# Altium footprint library Standard2.PcbLib: 423 footprints (part 10 of 27)
Each footprint in its own frame and in the unit in brackets; x right, y up, seen from the top. Pads: shape width x height; smd on the part's side, far side on the other; paste and mask are expansions set on the pad; w line width, h text height; cw(c..) or ccw(c..) is an arc to the next point about the centre after c.
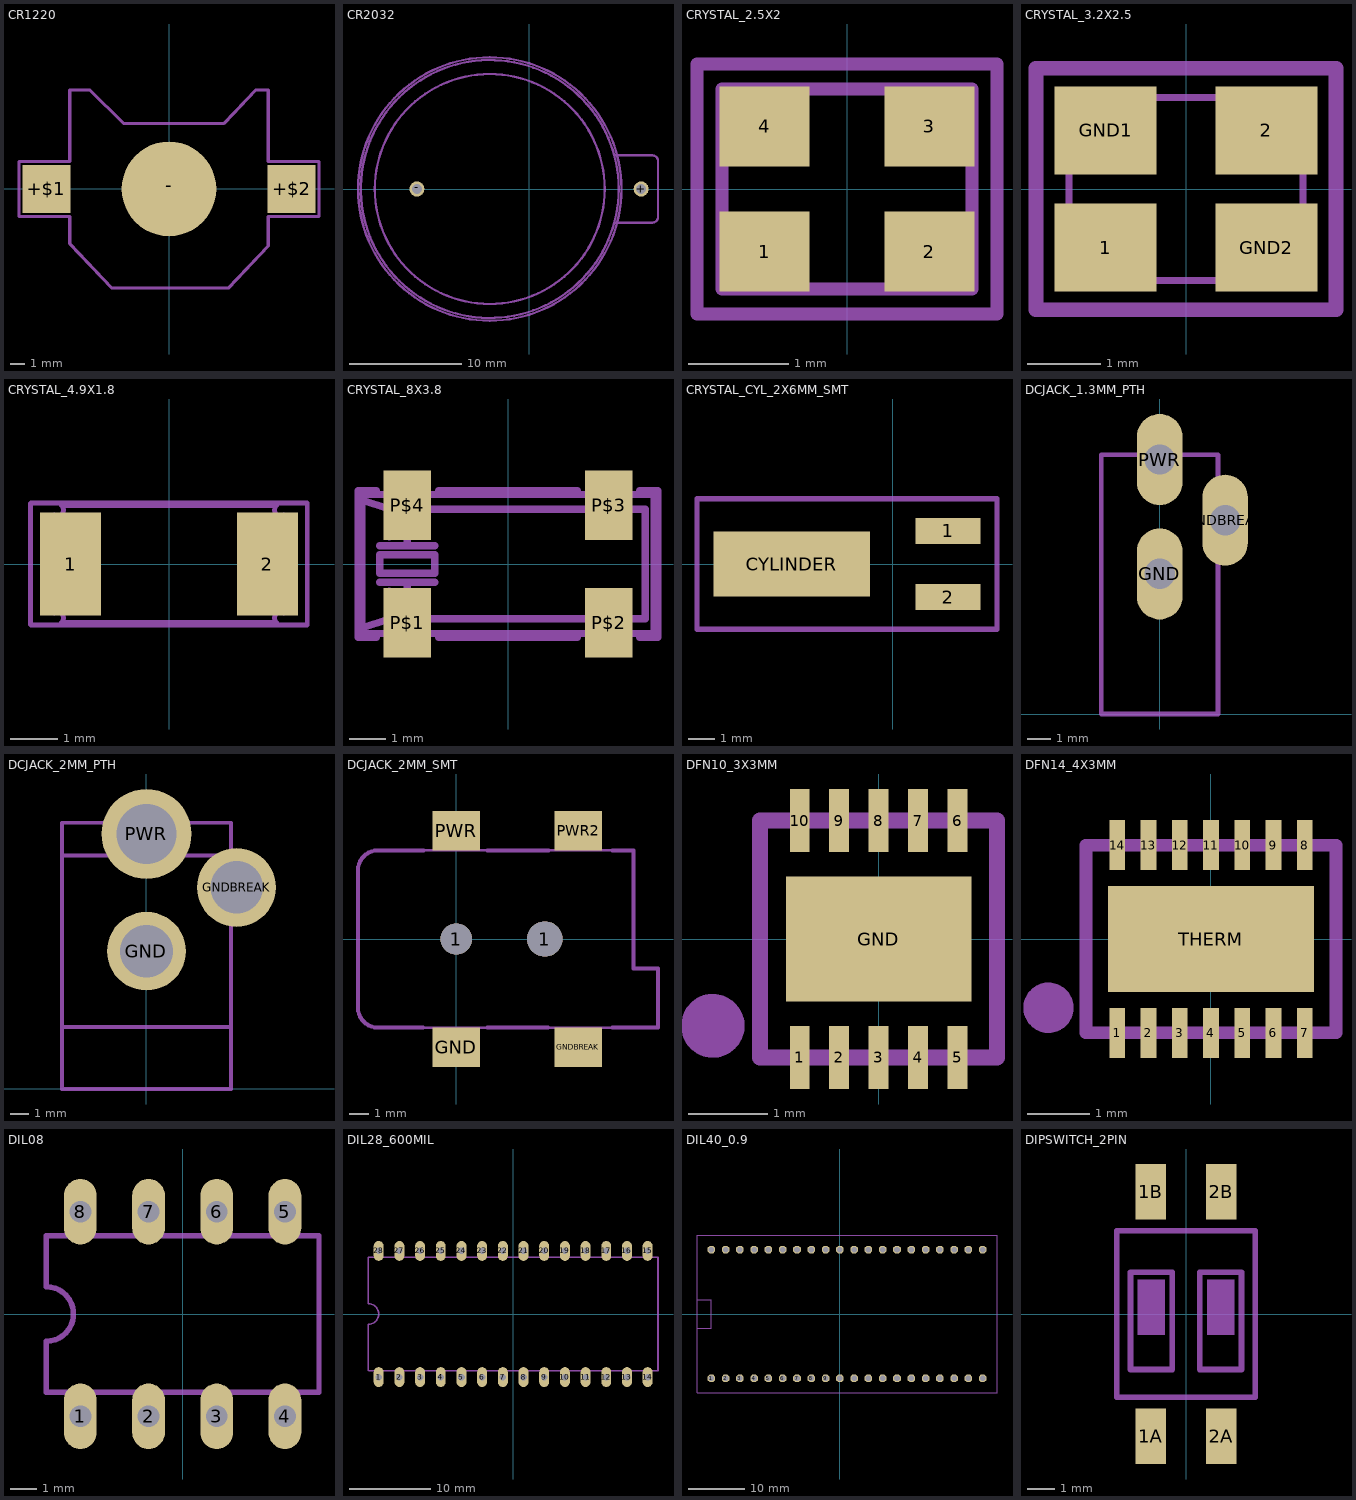
[diagram p9: the footprints below, top view; thin cyan lines are the x and y axes]

## CR1220 [mm]
pads (3):
  rect 3.2x3.2 smd: +$1(-8.225,0) +$2(8.225,0)
  rrect100% 6.35x6.35 smd mask-3.175: -(0,0)
Top Solder:
  circle w0: c0,0 r6.282
Mechanical 2:
  lines w0.203: -6.66,6.652 -6.66,1.84 -10.066,1.84 -10.066,-1.84 -6.66,-1.84 -6.66,-3.672 -3.826,-6.66 3.98,-6.66 6.66,-3.826 6.66,-1.84 10.066,-1.84 10.066,1.84 6.66,1.84 6.66,6.652
Mechanical 18:
  circle w0.203: c-8.279,0 r0.916
  circle w0.203: c8.425,0.154 r0.916
  lines w0.203: -6.66,6.652 -5.334,6.652 -3.048,4.404 3.702,4.404 5.842,6.652 6.66,6.652

## CR2032 [mm]
pads (2):
  round 1.35 hole 0.9: +(10,0) -(-10,0)
Mechanical 2:
  circle w0.203: c-3.5,0 r11.75
Mechanical 18:
  circle w0.203: c-3.5,0 r11.5
  circle w0.203: c-3.5,0 r10.25
  lines w0.203: 7.6,-3 11,-3 ccw(c11,-2.5) 11.5,-2.5 11.5,2.5 ccw(c11,2.5) 11,3 7.6,3

## CRYSTAL_2.5X2 [mm]
pads (4):
  rect 0.9x0.8 smd: 1(-0.825,-0.625) 2(0.825,-0.625) 3(0.825,0.625) 4(-0.825,0.625)
Mechanical 2:
  lines w0.127: -1.5,-1.25 -1.5,1.25 1.5,1.25 1.5,-1.25 -1.5,-1.25
Mechanical 18:
  lines w0.127: -1.25,-1 -1.25,1 1.25,1 1.25,-1 -1.25,-1

## CRYSTAL_3.2X2.5 [mil]
pads (4):
  rect 55.12x47.24 smd: 1(-43.31,-31.5) 2(43.31,31.5) GND1(-43.31,31.5) GND2(43.31,-31.5)
Mechanical 2:
  lines w8: -80.71,-64.96 80.71,-64.96 80.71,64.96 -80.71,64.96 -80.71,-64.96
Mechanical 18:
  lines w3.94: -62.99,-41.34 cw(c-59.05,-45.27) -55.12,-49.21 55.12,-49.21 cw(c59.05,-45.27) 62.99,-41.34 62.99,41.34 cw(c59.05,45.27) 55.12,49.21 -55.12,49.21 cw(c-59.05,45.27) -62.99,41.34 -62.99,-41.34

## CRYSTAL_4.9X1.8 [mm]
pads (2):
  rect 1.3x2.2 smd: 1(-2.1,0) 2(2.1,0)
Mechanical 2:
  lines w0.1: -2.955,-1.294 -2.955,1.294 ; -2.945,-1.3 2.945,-1.3 ; -2.945,1.3 2.945,1.3 ; 2.951,-1.294 2.951,1.294
Mechanical 18:
  lines w0.1: -2.45,-1.05 cw(c-2.375,-1.15) -2.3,-1.25 2.3,-1.25 cw(c2.375,-1.15) 2.45,-1.05 2.45,1.05 cw(c2.375,1.15) 2.3,1.25 -2.3,1.25 cw(c-2.375,1.15) -2.45,1.05 -2.45,-1.05

## CRYSTAL_8X3.8 [mm]
pads (4):
  rect 1.3x1.9 smd: P$1(-2.75,-1.6) P$2(2.75,-1.6) P$3(2.75,1.6) P$4(-2.75,1.6)
Mechanical 2:
  lines w0.203: -3.6,-2 -4.1,-2 -4.1,2 -3.6,2 ; -1.9,-2 1.9,-2 ; -1.9,2 1.9,2 ; 3.6,-2 4.1,-2 4.1,2 3.6,2
Mechanical 18:
  circle w0.203: c-2.75,1.25 r0.25
  circle w0.203: c-2.75,-1.25 r0.25
  lines w0.203: -3.5,-0.5 -2.75,-0.5 ; -3.5,0.5 -2.75,0.5 ; -3.25,-0.75 -3.25,-1.5 ; -3.25,0.75 -3.25,1.5 ; -2.75,-1.25 -2.75,-0.5 ; -2.75,1.25 -2.75,0.5 ; -2,-0.5 -2.75,-0.5 ; -2,0.5 -2.75,0.5 ; -4,-1.75 -4,-1.9 4,-1.9 4,1.9 -4,1.9 -4,1.75 ; -4,-1.75 -4,1.75 ; -4,-1.75 -3.25,-1.5 ; -4,1.75 -3.25,1.5 ; -3.25,-1.5 3.75,-1.5 3.75,1.5 -3.25,1.5 ; -3.5,-0.25 -2,-0.25 -2,0.25 -3.5,0.25 -3.5,-0.25

## CRYSTAL_CYL_2X6MM_SMT [mm]
pads (3):
  rect 2.5x1 smd: 1(2.125,1.27) 2(2.125,-1.27)
  rect 6x2.5 smd: CYLINDER(-3.875,0)
Mechanical 2:
  lines w0.203: -7.5,-2.5 -7.5,2.5 4,2.5 4,-2.5 -7.5,-2.5

## DCJACK_1.3MM_PTH [mm]
pads (3):
  oval 1.95x3.9 hole 1.3: GND(0,6) GNDBREAK(2.8,8.3) PWR(0,10.9)
Mechanical 2:
  lines w0.203: -1.5,11.1 -2.5,11.1 -2.5,0 2.5,0 2.5,11.1 1.5,11.1
Mechanical 18:
  lines w0.127: -2.5,11.1 -2.5,0 2.5,0 2.5,11.1
  lines w0.203: -2.5,11.1 2.5,11.1

## DCJACK_2MM_PTH [mm]
pads (3):
  round 4.2 hole 2.8: GND(0,7.35) GNDBREAK(4.8,10.75)
  round 4.8 hole 3.2: PWR(0,13.6)
Mechanical 2:
  lines w0.203: -2.6,14.2 -4.5,14.2 -4.5,3.3 4.5,3.3 4.5,8.4 ; 2.4,14.2 4.5,14.2 4.5,13.1
Mechanical 18:
  lines w0.203: 4.4,12.45 -4.5,12.45 ; -4.5,3.3 -4.5,0 4.5,0 4.5,3.3 ; -4.5,3.3 4.5,3.3 ; -4.5,3.3 -4.5,12.45 ; -4.5,12.45 -4.5,14.2 2.4,14.2 2.65,14.2 4.5,14.2 4.5,8.4 4.5,8.35 4.5,3.3

## DCJACK_2MM_SMT [mm]
pads (6):
  round 1.6 hole 1.6: 1(0,0)
  round 1.8 hole 1.8: 1(4.5,0)
  rect 2.4x2 smd: GND(0,-5.5) GNDBREAK(6.2,-5.5) PWR(0,5.5) PWR2(6.2,5.5)
Mechanical 2:
  lines w0.203: -1.684,-4.5 -4,-4.5 cw(c-4,-3.5) -5,-3.5 -5,3.5 cw(c-4,3.5) -4,4.5 -1.668,4.5 ; 1.588,-4.5 4.666,-4.5 ; 1.588,4.5 4.682,4.5 ; 7.938,-4.5 10.254,-4.5 10.254,-1.492 9,-1.492 9,4.5 7.938,4.5
Mechanical 18:
  lines w0.127: -5,-3.5 -5,3.5 ; -4,-4.5 10.254,-4.5 10.254,-1.492 9,-1.492 9,4.5 -4,4.5
  lines w0.203: -5,-3.5 ccw(c-4,-3.5) -4,-4.5 ; -5,3.5 cw(c-4,3.5) -4,4.5

## DFN10_3X3MM [mil]
pads (11):
  rect 9.84x31.5 smd: 1(-39.37,-59.06) 2(-19.69,-59.06) 3(0,-59.06) 4(19.69,-59.06) 5(39.37,-59.06) 6(39.37,59.06) 7(19.69,59.06) 8(0,59.06) 9(-19.69,59.06) 10(-39.37,59.06)
  rect 92.52x62.2 smd paste-46.26: GND(0,0)
Top Paste:
  rectangle: -39.37,3.94 -19.69,23.62
  rectangle: -39.37,-23.62 -19.69,-3.94
  rectangle: 19.69,3.94 39.37,23.62
  rectangle: 19.69,-23.62 39.37,-3.94
  rectangle: -11.81,-23.62 11.81,23.62
Mechanical 2:
  circle w16: c-82.68,-43.31 r7.87
  lines w8: -59.06,-59.06 -59.06,59.06 ; 59.06,-59.06 59.06,59.06
Mechanical 18:
  lines w5: -59.06,-59.06 -59.06,59.06 ; 59.06,-59.06 59.06,59.06
  lines w8: -59.06,-59.06 59.06,-59.06 ; -59.06,59.06 59.06,59.06

## DFN14_4X3MM [mil]
pads (15):
  rect 9.84x31.5 smd: 1(-59.06,-59.06) 2(-39.37,-59.06) 3(-19.69,-59.06) 4(0,-59.06) 5(19.69,-59.06) 6(39.37,-59.06) 7(59.06,-59.06) 8(59.06,59.06) 9(39.37,59.06) 10(19.69,59.06) 11(0,59.06) 12(-19.69,59.06) 13(-39.37,59.06) 14(-59.06,59.06)
  rect 129.92x66.93 smd paste-64.96: THERM(0,0)
Top Paste:
  rectangle: -31.5,-23.62 -7.87,23.62
  rectangle: 7.87,-23.62 31.5,23.62
  rectangle: -61.02,-23.62 -37.4,23.62
  rectangle: 37.4,-23.62 61.02,23.62
Mechanical 2:
  circle w16: c-102.36,-43.31 r7.87
  lines w8: -78.74,-59.06 -78.74,59.06 ; 78.74,-59.06 78.74,59.06
Mechanical 18:
  lines w5: -78.74,-59.06 -78.74,59.06 ; 78.74,-59.06 78.74,59.06
  lines w8: -78.74,-59.06 78.74,-59.06 ; -78.74,59.06 78.74,59.06

## DIL08 [mil]
pads (8):
  oval 48x96 hole 32: 1(-150,-150) 2(-50,-150) 3(50,-150) 4(150,-150) 5(150,150) 6(50,150) 7(-50,150) 8(-150,150)
Mechanical 2:
  lines w8: -200,-115 -200,-40 ccw(c-200,0) -200,40 -200,115 200,115 200,-115 -200,-115

## DIL28_600MIL [mil]
pads (28):
  oval 48x96 hole 32: 1(-650,-305.12) 2(-550,-305.12) 3(-450,-305.12) 4(-350,-305.12) 5(-250,-305.12) 6(-150,-305.12) 7(-50,-305.12) 8(50,-305.12) 9(150,-305.12) 10(250,-305.12) 11(350,-305.12) 12(450,-305.12) 13(550,-305.12) 14(650,-305.12) 15(650,305.12) 16(550,305.12) 17(450,305.12) 18(350,305.12) 19(250,305.12) 20(150,305.12) 21(50,305.12) 22(-50,305.12) 23(-150,305.12) 24(-250,305.12) 25(-350,305.12) 26(-450,305.12) 27(-550,305.12) 28(-650,305.12)
Mechanical 2:
  lines w8: -700,-273.62 -700,-50 ccw(c-700,0) -700,50 -700,273.62 700,273.62 700,-273.62 -695,-273.62

## DIL40_0.9 [mm]
pads (40):
  oct 1.353x1.353 hole 1: 1(-22.86,-11.43) 2(-20.32,-11.43) 3(-17.78,-11.43) 4(-15.24,-11.43) 5(-12.7,-11.43) 6(-10.16,-11.43) 7(-7.62,-11.43) 8(-5.08,-11.43) 9(-2.54,-11.43) 10(0,-11.43) 11(2.54,-11.43) 12(5.08,-11.43) 13(7.62,-11.43) 14(10.16,-11.43) 15(12.7,-11.43) 16(15.24,-11.43) 17(17.78,-11.43) 18(20.32,-11.43) 19(22.86,-11.43) 20(25.4,-11.43) 21(25.4,11.43) 22(22.86,11.43) 23(20.32,11.43) 24(17.78,11.43) 25(15.24,11.43) 26(12.7,11.43) 27(10.16,11.43) 28(7.62,11.43) 29(5.08,11.43) 30(2.54,11.43) 31(0,11.43) 32(-2.54,11.43) 33(-5.08,11.43) 34(-7.62,11.43) 35(-10.16,11.43) 36(-12.7,11.43) 37(-15.24,11.43) 38(-17.78,11.43) 39(-20.32,11.43) 40(-22.86,11.43)
Mechanical 2:
  lines w0.203: -25.4,-2.54 -22.86,-2.54 -22.86,2.54 -25.4,2.54 ; -25.4,-2.54 -25.4,2.54 ; -25.4,-2.54 -25.4,-13.97 27.94,-13.97 27.94,13.97 -25.4,13.97 -25.4,2.54

## DIPSWITCH_2PIN [mm]
pads (4):
  rect 1.1x2 smd: 1A(-1.27,-4.4) 1B(-1.27,4.4) 2A(1.27,-4.4) 2B(1.27,4.4)
Mechanical 2:
  lines w0.203: -2.49,-3 2.49,-3 2.49,3 -2.49,3 -2.49,-3
Mechanical 18:
  rectangle: 0.75,-0.75 1.75,1.25
  rectangle: -1.75,-0.75 -0.75,1.25
  lines w0.127: -2.49,-3 -2.49,3 2.49,3 2.49,-3 -2.49,-3
  lines w0.203: -2,-2 -2,1.5 -0.5,1.5 -0.5,-2 -2,-2 ; 0.5,-2 0.5,1.5 2,1.5 2,-2 0.5,-2